# Altium integrated library TI Power Management Battery Management.IntLib: 950 symbols (part 10 of 48) (continued)
## BQ2016DBQG4 (continued)

## BQ2018SN-E1
designator U?
Multi-Chemistry Charge / Discharge Counter with High-Speed 1-Wire I / F (HDQ), -20 to 70 degC, 8-pin SOIC (D), Green (RoHS & no Sb/Br); PartNumber: BQ2018SN-E1; Manufacturer: Texas Instruments; Lead Acid: Y; Over Voltage Protection: N; SubFamily: Battery Fuel Gauge; DatasheetVersion: SLUS003; PackageVersion: revM, Jun-2011; PackageReference: D8; PackageDescription: 8-Pin Plastic Small Outline Integrated Circuit, 4.9 x 3.9 mm, Pitch 1.27 mm Pitch; Supplier 1: Digi-Key; Supplier Part Number 1: 296-2221-5-ND; Supplier Part Number 3: 595-BQ2018SN-E1; Eco-Plan: Green (RoHS & no Sb/Br); Li-Ion: Y; Li-Polymer: Y; NiCd: Y; NiMH: Y; Mounting Technology: Surface Mount; Code_JEDEC: MS-012AA; ComponentLink1Description: Datasheet; ComponentLink1URL: http://www.ti.com/general/docs/lit/getliterature.tsp?genericPartNumber=BQ2018&fileType=pdf
footprint D8_N (SOIC, 8-Leads, Body 4.9x3.9mm, Pitch 1.27mm, IPC Medium Density)
footprint D8_L (SOIC, 8-Leads, Body 4.9x3.9mm, Pitch 1.27mm, IPC High Density)
footprint D8_M (SOIC, 8-Leads, Body 4.9x3.9mm, Pitch 1.27mm, IPC Low Density)
pins: 1 REG (power) "Regulator output.REG is the output of the operational transconductance amplifier (OTA) that drives an external pass n-channel JFET to provide an optional regulated supply. The supply is regulated at 3.7V nominal.", 2 VCC (power) "Supply voltage input.When regulated by the REG output, VCC is 3.7V +/-200mV. When the REG output is not used, the valid operating range is 2.8V to 5.5V.", 3 VSS (power) "Ground", 4 HDQ (io) "Data input/output.This bi-directional input/output communicates the register information to the host system. HDQ is open drain and requires a pullup/down resistor in the battery pack to disable/enable sleep mode if the pack (See Datasheet)", 5 RBI (power) "Register backup input.This input maintains the internal register states during periods when VCC is below the minimum operating voltage.", 6 SR2 (in) "Current sense input 2.The bq2018 interprets charge and discharge activity by monitoring and integrating the voltage drop (VSR) across pins SR1 and SR2.The SR1 input connects to the sense resistor and the negative terminal of (See Datasheet)", 7 SR1 (in) "Current sense input 1.The bq2018 interprets charge and discharge activity by monitoring and integrating the voltage drop (VSR) across pins SR1 and SR2.The SR1 input connects to the sense resistor and the negative terminal of (See Datasheet)", 8 ~{WAKE} (hiz) "Wake-up output.When asserted, this output is used to indicate that the charge or discharge activity is above a programmed minimal level."

## BQ2018SN-E1TR
designator U?
Multi-Chemistry Charge / Discharge Counter with High-Speed 1-Wire I / F (HDQ), -20 to 70 degC, 8-pin SOIC (D), Green (RoHS & no Sb/Br); PartNumber: BQ2018SN-E1TR; Manufacturer: Texas Instruments; Lead Acid: Y; Over Voltage Protection: N; SubFamily: Battery Fuel Gauge; DatasheetVersion: SLUS003; PackageVersion: revM, Jun-2011; PackageReference: D8; PackageDescription: 8-Pin Plastic Small Outline Integrated Circuit, 4.9 x 3.9 mm, Pitch 1.27 mm Pitch; Supplier 1: Digi-Key; Supplier Part Number 1: BQ2018SN-E1TR-ND; Supplier Part Number 3: 595-BQ2018SN-E1TR; Eco-Plan: Green (RoHS & no Sb/Br); Li-Ion: Y; Li-Polymer: Y; NiCd: Y; NiMH: Y; Mounting Technology: Surface Mount; Code_JEDEC: MS-012AA; ComponentLink1Description: Datasheet; ComponentLink1URL: http://www.ti.com/general/docs/lit/getliterature.tsp?genericPartNumber=BQ2018&fileType=pdf
footprint D8_N (SOIC, 8-Leads, Body 4.9x3.9mm, Pitch 1.27mm, IPC Medium Density)
footprint D8_L (SOIC, 8-Leads, Body 4.9x3.9mm, Pitch 1.27mm, IPC High Density)
footprint D8_M (SOIC, 8-Leads, Body 4.9x3.9mm, Pitch 1.27mm, IPC Low Density)
pins: 1 REG (power) "Regulator output.REG is the output of the operational transconductance amplifier (OTA) that drives an external pass n-channel JFET to provide an optional regulated supply. The supply is regulated at 3.7V nominal.", 2 VCC (power) "Supply voltage input.When regulated by the REG output, VCC is 3.7V +/-200mV. When the REG output is not used, the valid operating range is 2.8V to 5.5V.", 3 VSS (power) "Ground", 4 HDQ (io) "Data input/output.This bi-directional input/output communicates the register information to the host system. HDQ is open drain and requires a pullup/down resistor in the battery pack to disable/enable sleep mode if the pack (See Datasheet)", 5 RBI (power) "Register backup input.This input maintains the internal register states during periods when VCC is below the minimum operating voltage.", 6 SR2 (in) "Current sense input 2.The bq2018 interprets charge and discharge activity by monitoring and integrating the voltage drop (VSR) across pins SR1 and SR2.The SR1 input connects to the sense resistor and the negative terminal of (See Datasheet)", 7 SR1 (in) "Current sense input 1.The bq2018 interprets charge and discharge activity by monitoring and integrating the voltage drop (VSR) across pins SR1 and SR2.The SR1 input connects to the sense resistor and the negative terminal of (See Datasheet)", 8 ~{WAKE} (hiz) "Wake-up output.When asserted, this output is used to indicate that the charge or discharge activity is above a programmed minimal level."

## BQ2018SN-E1TRG4
designator U?
Multi-Chemistry Charge / Discharge Counter with High-Speed 1-Wire I / F (HDQ), -20 to 70 degC, 8-pin SOIC (D), Green (RoHS & no Sb/Br); PartNumber: BQ2018SN-E1TRG4; Manufacturer: Texas Instruments; Lead Acid: Y; Over Voltage Protection: N; SubFamily: Battery Fuel Gauge; DatasheetVersion: SLUS003; PackageVersion: revM, Jun-2011; PackageReference: D8; PackageDescription: 8-Pin Plastic Small Outline Integrated Circuit, 4.9 x 3.9 mm, Pitch 1.27 mm Pitch; Supplier 1: Digi-Key; Supplier Part Number 1: BQ2018SN-E1TRG4-ND; Supplier Part Number 3: 595-BQ2018SN-E1TRG4; Eco-Plan: Green (RoHS & no Sb/Br); Li-Ion: Y; Li-Polymer: Y; NiCd: Y; NiMH: Y; Mounting Technology: Surface Mount; Code_JEDEC: MS-012AA; ComponentLink1Description: Datasheet; ComponentLink1URL: http://www.ti.com/general/docs/lit/getliterature.tsp?genericPartNumber=BQ2018&fileType=pdf
footprint D8_N (SOIC, 8-Leads, Body 4.9x3.9mm, Pitch 1.27mm, IPC Medium Density)
footprint D8_L (SOIC, 8-Leads, Body 4.9x3.9mm, Pitch 1.27mm, IPC High Density)
footprint D8_M (SOIC, 8-Leads, Body 4.9x3.9mm, Pitch 1.27mm, IPC Low Density)
pins: 1 REG (power) "Regulator output.REG is the output of the operational transconductance amplifier (OTA) that drives an external pass n-channel JFET to provide an optional regulated supply. The supply is regulated at 3.7V nominal.", 2 VCC (power) "Supply voltage input.When regulated by the REG output, VCC is 3.7V +/-200mV. When the REG output is not used, the valid operating range is 2.8V to 5.5V.", 3 VSS (power) "Ground", 4 HDQ (io) "Data input/output.This bi-directional input/output communicates the register information to the host system. HDQ is open drain and requires a pullup/down resistor in the battery pack to disable/enable sleep mode if the pack (See Datasheet)", 5 RBI (power) "Register backup input.This input maintains the internal register states during periods when VCC is below the minimum operating voltage.", 6 SR2 (in) "Current sense input 2.The bq2018 interprets charge and discharge activity by monitoring and integrating the voltage drop (VSR) across pins SR1 and SR2.The SR1 input connects to the sense resistor and the negative terminal of (See Datasheet)", 7 SR1 (in) "Current sense input 1.The bq2018 interprets charge and discharge activity by monitoring and integrating the voltage drop (VSR) across pins SR1 and SR2.The SR1 input connects to the sense resistor and the negative terminal of (See Datasheet)", 8 ~{WAKE} (hiz) "Wake-up output.When asserted, this output is used to indicate that the charge or discharge activity is above a programmed minimal level."

## BQ2018TS-E1
designator U?
Multi-Chemistry Charge / Discharge Counter with High-Speed 1-Wire I / F (HDQ), -20 to 70 degC, 8-pin TSSOP (PW), Green (RoHS & no Sb/Br); PartNumber: BQ2018TS-E1; Manufacturer: Texas Instruments; Lead Acid: Y; Over Voltage Protection: N; SubFamily: Battery Fuel Gauge; DatasheetVersion: SLUS003; PackageVersion: revG, Feb-2011; PackageReference: PW8; PackageDescription: 8-Pin Plastic Thin Small Outline Package 3 x 4.4 mm Body ,0.65 mm Pitch; Supplier 1: Digi-Key; Supplier Part Number 1: 296-2222-5-ND; Supplier Part Number 3: 595-BQ2018TS-E1; Eco-Plan: Green (RoHS & no Sb/Br); Li-Ion: Y; Li-Polymer: Y; NiCd: Y; NiMH: Y; Mounting Technology: Surface Mount; Code_JEDEC: MO-153; ComponentLink1Description: Datasheet; ComponentLink1URL: http://www.ti.com/general/docs/lit/getliterature.tsp?genericPartNumber=BQ2018&fileType=pdf
footprint PW8_N (TSOP, 8-Leads, Body 3x4.4mm, Pitch 0.65mm, IPC Medium Density)
footprint PW8_L (TSOP, 8-Leads, Body 3x4.4mm, Pitch 0.65mm, IPC High Density)
footprint PW8_M (TSOP, 8-Leads, Body 3x4.4mm, Pitch 0.65mm, IPC Low Density)
pins: 1 REG (power) "Regulator output.REG is the output of the operational transconductance amplifier (OTA) that drives an external pass n-channel JFET to provide an opt ional  regulated  supply. The  supply  is regulated at 3.7V nominal.", 2 VCC (power) "Supply voltage input.When regulated by the REG output, VCC is 3.7V +/-200mV. When the REG output is not used, the valid operating range is 2.8V to 5.5V.", 3 VSS (power) "Ground", 4 HDQ (io) "Data input/output.This bi-directional input/output communicates the register information to the host system. HDQ is open drain and requires a pullup/down resistor in the battery pack to disable/enable sleep mode if the pack (See Datasheet)", 5 RBI (power) "Register backup input.This input maintains the internal register states during periods when VCC is below the minimum operating voltage.", 6 SR2 (in) "Current sense inputs.The bq2018 interprets charge and discharge activity by monitoring and integrating the voltage drop (VSR) across pins SR1 and SR2.The SR1 input connects to the sense resistor and the negative terminal of (See Datasheet)", 7 SR1 (in) "Current sense inputs.The bq2018 interprets charge and discharge activity by monitoring and integrating the voltage drop (VSR) across pins SR1 and SR2.The SR1 input connects to the sense resistor and the negative terminal of (See Datasheet)", 8 ~{WAKE} (hiz) "Wake-up output.When asserted, this output is used to indicate that the charge or discharge activity is above a programmed minimal level."

## BQ2018TS-E1TR
designator U?
Multi-Chemistry Charge / Discharge Counter with High-Speed 1-Wire I / F (HDQ), -20 to 70 degC, 8-pin TSSOP (PW), Green (RoHS & no Sb/Br); PartNumber: BQ2018TS-E1TR; Manufacturer: Texas Instruments; Lead Acid: Y; Over Voltage Protection: N; SubFamily: Battery Fuel Gauge; DatasheetVersion: SLUS003; PackageVersion: revG, Feb-2011; PackageReference: PW8; PackageDescription: 8-Pin Plastic Thin Small Outline Package 3 x 4.4 mm Body ,0.65 mm Pitch; Supplier 1: Digi-Key; Supplier Part Number 1: BQ2018TS-E1TR-ND; Supplier Part Number 3: 595-BQ2018TS-E1TR; Eco-Plan: Green (RoHS & no Sb/Br); Li-Ion: Y; Li-Polymer: Y; NiCd: Y; NiMH: Y; Mounting Technology: Surface Mount; Code_JEDEC: MO-153; ComponentLink1Description: Datasheet; ComponentLink1URL: http://www.ti.com/general/docs/lit/getliterature.tsp?genericPartNumber=BQ2018&fileType=pdf
footprint PW8_N (TSOP, 8-Leads, Body 3x4.4mm, Pitch 0.65mm, IPC Medium Density)
footprint PW8_L (TSOP, 8-Leads, Body 3x4.4mm, Pitch 0.65mm, IPC High Density)
footprint PW8_M (TSOP, 8-Leads, Body 3x4.4mm, Pitch 0.65mm, IPC Low Density)
pins: 1 REG (power) "Regulator output.REG is the output of the operational transconductance amplifier (OTA) that drives an external pass n-channel JFET to provide an opt ional  regulated  supply. The  supply  is regulated at 3.7V nominal.", 2 VCC (power) "Supply voltage input.When regulated by the REG output, VCC is 3.7V +/-200mV. When the REG output is not used, the valid operating range is 2.8V to 5.5V.", 3 VSS (power) "Ground", 4 HDQ (io) "Data input/output.This bi-directional input/output communicates the register information to the host system. HDQ is open drain and requires a pullup/down resistor in the battery pack to disable/enable sleep mode if the pack (See Datasheet)", 5 RBI (power) "Register backup input.This input maintains the internal register states during periods when VCC is below the minimum operating voltage.", 6 SR2 (in) "Current sense inputs.The bq2018 interprets charge and discharge activity by monitoring and integrating the voltage drop (VSR) across pins SR1 and SR2.The SR1 input connects to the sense resistor and the negative terminal of (See Datasheet)", 7 SR1 (in) "Current sense inputs.The bq2018 interprets charge and discharge activity by monitoring and integrating the voltage drop (VSR) across pins SR1 and SR2.The SR1 input connects to the sense resistor and the negative terminal of (See Datasheet)", 8 ~{WAKE} (hiz) "Wake-up output.When asserted, this output is used to indicate that the charge or discharge activity is above a programmed minimal level."

## BQ2018TS-E1TRG4
designator U?
Multi-Chemistry Charge / Discharge Counter with High-Speed 1-Wire I / F (HDQ), -20 to 70 degC, 8-pin TSSOP (PW), Green (RoHS & no Sb/Br); PartNumber: BQ2018TS-E1TRG4; Manufacturer: Texas Instruments; Lead Acid: Y; Over Voltage Protection: N; SubFamily: Battery Fuel Gauge; DatasheetVersion: SLUS003; PackageVersion: revG, Feb-2011; PackageReference: PW8; PackageDescription: 8-Pin Plastic Thin Small Outline Package 3 x 4.4 mm Body ,0.65 mm Pitch; Supplier 1: Digi-Key; Supplier Part Number 1: BQ2018TS-E1TRG4-ND; Supplier Part Number 3: 595-BQ2018TS-E1TRG4; Eco-Plan: Green (RoHS & no Sb/Br); Li-Ion: Y; Li-Polymer: Y; NiCd: Y; NiMH: Y; Mounting Technology: Surface Mount; Code_JEDEC: MO-153; ComponentLink1Description: Datasheet; ComponentLink1URL: http://www.ti.com/general/docs/lit/getliterature.tsp?genericPartNumber=BQ2018&fileType=pdf
footprint PW8_N (TSOP, 8-Leads, Body 3x4.4mm, Pitch 0.65mm, IPC Medium Density)
footprint PW8_L (TSOP, 8-Leads, Body 3x4.4mm, Pitch 0.65mm, IPC High Density)
footprint PW8_M (TSOP, 8-Leads, Body 3x4.4mm, Pitch 0.65mm, IPC Low Density)
pins: 1 REG (power) "Regulator output.REG is the output of the operational transconductance amplifier (OTA) that drives an external pass n-channel JFET to provide an opt ional  regulated  supply. The  supply  is regulated at 3.7V nominal.", 2 VCC (power) "Supply voltage input.When regulated by the REG output, VCC is 3.7V +/-200mV. When the REG output is not used, the valid operating range is 2.8V to 5.5V.", 3 VSS (power) "Ground", 4 HDQ (io) "Data input/output.This bi-directional input/output communicates the register information to the host system. HDQ is open drain and requires a pullup/down resistor in the battery pack to disable/enable sleep mode if the pack (See Datasheet)", 5 RBI (power) "Register backup input.This input maintains the internal register states during periods when VCC is below the minimum operating voltage.", 6 SR2 (in) "Current sense inputs.The bq2018 interprets charge and discharge activity by monitoring and integrating the voltage drop (VSR) across pins SR1 and SR2.The SR1 input connects to the sense resistor and the negative terminal of (See Datasheet)", 7 SR1 (in) "Current sense inputs.The bq2018 interprets charge and discharge activity by monitoring and integrating the voltage drop (VSR) across pins SR1 and SR2.The SR1 input connects to the sense resistor and the negative terminal of (See Datasheet)", 8 ~{WAKE} (hiz) "Wake-up output.When asserted, this output is used to indicate that the charge or discharge activity is above a programmed minimal level."

## BQ2019PW
designator U?
FLASH-Based Precision Multi-Chemistry Charge / Discharge Counter with High-Speed 1-Wire I / F (HDQ) , -20 to 70 degC, 8-pin TSSOP (PW), Green (RoHS & no Sb/Br); PartNumber: BQ2019PW; Manufacturer: Texas Instruments; Lead Acid: Y; Over Voltage Protection: N; SubFamily: Battery Fuel Gauge; DatasheetVersion: SLUS465E; PackageVersion: revG, Feb-2011; PackageReference: PW8; PackageDescription: 8-Pin Plastic Thin Small Outline Package 3 x 4.4 mm Body ,0.65 mm Pitch; Supplier 1: Digi-Key; Supplier Part Number 1: 296-9348-5-ND; Supplier Part Number 3: 595-BQ2019PW; Eco-Plan: Green (RoHS & no Sb/Br); Li-Ion: Y; Li-Polymer: Y; NiCd: Y; NiMH: Y; Mounting Technology: Surface Mount; Code_JEDEC: MO-153; ComponentLink1Description: Datasheet; ComponentLink1URL: http://www.ti.com/general/docs/lit/getliterature.tsp?genericPartNumber=BQ2019&fileType=pdf
footprint PW8_N (TSOP, 8-Leads, Body 3x4.4mm, Pitch 0.65mm, IPC Medium Density)
footprint PW8_L (TSOP, 8-Leads, Body 3x4.4mm, Pitch 0.65mm, IPC High Density)
footprint PW8_M (TSOP, 8-Leads, Body 3x4.4mm, Pitch 0.65mm, IPC Low Density)
pins: 1 REG (power) "Regulator output", 2 VCC (power) "Supply voltage", 3 VSS (power) "Ground", 4 HDQ (io) "Single-wire HDQ interface", 5 OSC (in) "Time-base adjust for the oscillator", 6 DC "Internal connection only. Do not connect", 7 SR (in) "Current-sense input", 8 STAT (oc) "Open-drain status output"

## BQ2019PWG4
designator U?
FLASH-Based Precision Multi-Chemistry Charge / Discharge Counter with High-Speed 1-Wire I / F (HDQ) , -20 to 70 degC, 8-pin TSSOP (PW), Green (RoHS & no Sb/Br); PartNumber: BQ2019PWG4; Manufacturer: Texas Instruments; Lead Acid: Y; Over Voltage Protection: N; SubFamily: Battery Fuel Gauge; DatasheetVersion: SLUS465E; PackageVersion: revG, Feb-2011; PackageReference: PW8; PackageDescription: 8-Pin Plastic Thin Small Outline Package 3 x 4.4 mm Body ,0.65 mm Pitch; Supplier 1: Digi-Key; Supplier Part Number 1: BQ2019PWG4-ND; Supplier Part Number 3: 53K9216; Eco-Plan: Green (RoHS & no Sb/Br); Li-Ion: Y; Li-Polymer: Y; NiCd: Y; NiMH: Y; Mounting Technology: Surface Mount; Code_JEDEC: MO-153; ComponentLink1Description: Datasheet; ComponentLink1URL: http://www.ti.com/general/docs/lit/getliterature.tsp?genericPartNumber=BQ2019&fileType=pdf
footprint PW8_N (TSOP, 8-Leads, Body 3x4.4mm, Pitch 0.65mm, IPC Medium Density)
footprint PW8_L (TSOP, 8-Leads, Body 3x4.4mm, Pitch 0.65mm, IPC High Density)
footprint PW8_M (TSOP, 8-Leads, Body 3x4.4mm, Pitch 0.65mm, IPC Low Density)
pins: 1 REG (power) "Regulator output", 2 VCC (power) "Supply voltage", 3 VSS (power) "Ground", 4 HDQ (io) "Single-wire HDQ interface", 5 OSC (in) "Time-base adjust for the oscillator", 6 DC "Internal connection only. Do not connect", 7 SR (in) "Current-sense input", 8 STAT (oc) "Open-drain status output"

## BQ2019PWR
designator U?
FLASH-Based Precision Multi-Chemistry Charge / Discharge Counter with High-Speed 1-Wire I / F (HDQ) , -20 to 70 degC, 8-pin TSSOP (PW), Green (RoHS & no Sb/Br); PartNumber: BQ2019PWR; Manufacturer: Texas Instruments; Lead Acid: Y; Over Voltage Protection: N; SubFamily: Battery Fuel Gauge; DatasheetVersion: SLUS465E; PackageVersion: revG, Feb-2011; PackageReference: PW8; PackageDescription: 8-Pin Plastic Thin Small Outline Package 3 x 4.4 mm Body ,0.65 mm Pitch; Supplier 1: Digi-Key; Supplier Part Number 1: BQ2019PWR-ND; Supplier Part Number 3: 595-BQ2019PWR; Eco-Plan: Green (RoHS & no Sb/Br); Li-Ion: Y; Li-Polymer: Y; NiCd: Y; NiMH: Y; Mounting Technology: Surface Mount; Code_JEDEC: MO-153; ComponentLink1Description: Datasheet; ComponentLink1URL: http://www.ti.com/general/docs/lit/getliterature.tsp?genericPartNumber=BQ2019&fileType=pdf
footprint PW8_N (TSOP, 8-Leads, Body 3x4.4mm, Pitch 0.65mm, IPC Medium Density)
footprint PW8_L (TSOP, 8-Leads, Body 3x4.4mm, Pitch 0.65mm, IPC High Density)
footprint PW8_M (TSOP, 8-Leads, Body 3x4.4mm, Pitch 0.65mm, IPC Low Density)
pins: 1 REG (power) "Regulator output", 2 VCC (power) "Supply voltage", 3 VSS (power) "Ground", 4 HDQ (io) "Single-wire HDQ interface", 5 OSC (in) "Time-base adjust for the oscillator", 6 DC "Internal connection only. Do not connect", 7 SR (in) "Current-sense input", 8 STAT (oc) "Open-drain status output"

## BQ2019PWRG4
designator U?
FLASH-Based Precision Multi-Chemistry Charge / Discharge Counter with High-Speed 1-Wire I / F (HDQ) , -20 to 70 degC, 8-pin TSSOP (PW), Green (RoHS & no Sb/Br); PartNumber: BQ2019PWRG4; Manufacturer: Texas Instruments; Lead Acid: Y; Over Voltage Protection: N; SubFamily: Battery Fuel Gauge; DatasheetVersion: SLUS465E; PackageVersion: revG, Feb-2011; PackageReference: PW8; PackageDescription: 8-Pin Plastic Thin Small Outline Package 3 x 4.4 mm Body ,0.65 mm Pitch; Supplier 1: Digi-Key; Supplier Part Number 1: BQ2019PWRG4-ND; Supplier Part Number 3: 595-BQ2019PWRG4; Eco-Plan: Green (RoHS & no Sb/Br); Li-Ion: Y; Li-Polymer: Y; NiCd: Y; NiMH: Y; Mounting Technology: Surface Mount; Code_JEDEC: MO-153; ComponentLink1Description: Datasheet; ComponentLink1URL: http://www.ti.com/general/docs/lit/getliterature.tsp?genericPartNumber=BQ2019&fileType=pdf
footprint PW8_N (TSOP, 8-Leads, Body 3x4.4mm, Pitch 0.65mm, IPC Medium Density)
footprint PW8_L (TSOP, 8-Leads, Body 3x4.4mm, Pitch 0.65mm, IPC High Density)
footprint PW8_M (TSOP, 8-Leads, Body 3x4.4mm, Pitch 0.65mm, IPC Low Density)
pins: 1 REG (power) "Regulator output", 2 VCC (power) "Supply voltage", 3 VSS (power) "Ground", 4 HDQ (io) "Single-wire HDQ interface", 5 OSC (in) "Time-base adjust for the oscillator", 6 DC "Internal connection only. Do not connect", 7 SR (in) "Current-sense input", 8 STAT (oc) "Open-drain status output"

## BQ2022ADBZR
designator U?
1K Bit Serial EPROM with SDQ Interface, -20 to 70 degC, 3-pin SOT-23 (DBZ), Green (RoHS & no Sb/Br); PartNumber: BQ2022ADBZR; Manufacturer: Texas Instruments; Lead Acid: N; SubFamily: Battery Fuel Gauge,Battery Authentication; DatasheetVersion: SLUS724C; PackageVersion: revB, Apr-2005; PackageReference: DBZ3; PackageDescription: 3-Pin Plastic Small-Outline Package, 0.95 mm Pitch, 2.4 mm Lead Span; Supplier 1: Digi-Key; Supplier Part Number 1: 296-20742-2-ND; Supplier Part Number 3: 296-20742-6-ND; Eco-Plan: Green (RoHS & no Sb/Br); Li-Ion: N; Li-Polymer: N; NiCd: N; NiMH: N; Over Voltage Protection: N; Mounting Technology: Surface Mount; Code_JEDEC: TO-236-AB; ComponentLink1Description: Datasheet; ComponentLink1URL: http://www.ti.com/general/docs/lit/getliterature.tsp?genericPartNumber=BQ2022A&fileType=pdf
footprint DBZ3_N (SOT23, 3-Leads, Body 2.9x1.3mm, Pitch 0.95mm, Lead Span 2.4mm, IPC Medium Density)
footprint DBZ3_L (SOT23, 3-Leads, Body 2.9x1.3mm, Pitch 0.95mm, Lead Span 2.4mm, IPC High Density)
footprint DBZ3_M (SOT23, 3-Leads, Body 2.9x1.3mm, Pitch 0.95mm, Lead Span 2.4mm, IPC Low Density)
pins: 1 SDQ (io) "Data", 2 VSS (power) "Ground. Both pins should be connected to system ground.", 3 VSS (power) "Ground. Both pins should be connected to system ground."

## BQ2022ADBZRG4
designator U?
1K Bit Serial EPROM with SDQ Interface, -20 to 70 degC, 3-pin SOT-23 (DBZ), Green (RoHS & no Sb/Br); PartNumber: BQ2022ADBZRG4; Manufacturer: Texas Instruments; Lead Acid: N; SubFamily: Battery Fuel Gauge,Battery Authentication; DatasheetVersion: SLUS724C; PackageVersion: revB, Apr-2005; PackageReference: DBZ3; PackageDescription: 3-Pin Plastic Small-Outline Package, 0.95 mm Pitch, 2.4 mm Lead Span; Supplier 1: Digi-Key; Supplier Part Number 1: BQ2022ADBZRG4-ND; Supplier Part Number 3: 595-BQ2022ADBZRG4; Eco-Plan: Green (RoHS & no Sb/Br); Li-Ion: N; Li-Polymer: N; NiCd: N; NiMH: N; Over Voltage Protection: N; Mounting Technology: Surface Mount; Code_JEDEC: TO-236-AB; ComponentLink1Description: Datasheet; ComponentLink1URL: http://www.ti.com/general/docs/lit/getliterature.tsp?genericPartNumber=BQ2022A&fileType=pdf
footprint DBZ3_N (SOT23, 3-Leads, Body 2.9x1.3mm, Pitch 0.95mm, Lead Span 2.4mm, IPC Medium Density)
footprint DBZ3_L (SOT23, 3-Leads, Body 2.9x1.3mm, Pitch 0.95mm, Lead Span 2.4mm, IPC High Density)
footprint DBZ3_M (SOT23, 3-Leads, Body 2.9x1.3mm, Pitch 0.95mm, Lead Span 2.4mm, IPC Low Density)
pins: 1 SDQ (io) "Data", 2 VSS (power) "Ground. Both pins should be connected to system ground.", 3 VSS (power) "Ground. Both pins should be connected to system ground."

## BQ2022ALPR
designator U?
1K Bit Serial EPROM with SDQ Interface, 0 to 70 degC, 3-pin TO-92 (LP), Green (RoHS & no Sb/Br); PartNumber: BQ2022ALPR; Manufacturer: Texas Instruments; Lead Acid: N; SubFamily: Battery Fuel Gauge,Battery Authentication; DatasheetVersion: SLUS724C; PackageVersion: revC, Oct-2001; PackageReference: LP3; PackageDescription: Plastic Cylindrical Package, Formed Lead Option (TO-92); Supplier 1: Digi-Key; Supplier Part Number 1: 296-21327-3-ND; Supplier Part Number 3: 1647890; Eco-Plan: Green (RoHS & no Sb/Br); Li-Ion: N; Li-Polymer: N; NiCd: N; NiMH: N; Over Voltage Protection: N; Mounting Technology: Through Hole; Code_JEDEC: TO-226-AA; ComponentLink1Description: Datasheet; ComponentLink1URL: http://www.ti.com/general/docs/lit/getliterature.tsp?genericPartNumber=BQ2022A&fileType=pdf
footprint LP3 (TO, Flat Index; 3 In-Line, Formed Axial Leads; Body Dia. 4.8mm; Leads 0.56 x 0.41 mm (max))
pins: 1 VSS (power) "GND", 2 SDQ (io) "Data", 3 NC "No connection. This pin should be connected to system ground or left floating."

## BQ2022ALPRE3
designator U?
1K Bit Serial EPROM with SDQ Interface, 0 to 70 degC, 3-pin TO-92 (LP), Green (RoHS & no Sb/Br); PartNumber: BQ2022ALPRE3; Manufacturer: Texas Instruments; Lead Acid: N; SubFamily: Battery Fuel Gauge,Battery Authentication; DatasheetVersion: SLUS724C; PackageVersion: revC, Oct-2001; PackageReference: LP3; PackageDescription: Plastic Cylindrical Package, Formed Lead Option (TO-92); Supplier 1: Digi-Key; Supplier Part Number 1: BQ2022ALPRE3-ND; Supplier Part Number 3: 595-BQ2022ALPRE3; Eco-Plan: Green (RoHS & no Sb/Br); Li-Ion: N; Li-Polymer: N; NiCd: N; NiMH: N; Over Voltage Protection: N; Mounting Technology: Through Hole; Code_JEDEC: TO-226-AA; ComponentLink1Description: Datasheet; ComponentLink1URL: http://www.ti.com/general/docs/lit/getliterature.tsp?genericPartNumber=BQ2022A&fileType=pdf
footprint LP3 (TO, Flat Index; 3 In-Line, Formed Axial Leads; Body Dia. 4.8mm; Leads 0.56 x 0.41 mm (max))
pins: 1 VSS (power) "GND", 2 SDQ (io) "Data", 3 NC "No connection. This pin should be connected to system ground or left floating."

## BQ2023PW
designator U?
Single-Wire Advanced Battery Monitor IC for Cellular and PDA Applications, -20 to 70 degC, 8-pin TSSOP (PW), Green (RoHS & no Sb/Br); PartNumber: BQ2023PW; Manufacturer: Texas Instruments; Lead Acid: Y; Over Voltage Protection: N; SubFamily: Battery Fuel Gauge; DatasheetVersion: SLUS480B; PackageVersion: revG, Feb-2011; PackageReference: PW8; PackageDescription: 8-Pin Plastic Thin Small Outline Package 3 x 4.4 mm Body ,0.65 mm Pitch; Supplier 1: Digi-Key; Supplier Part Number 1: 296-11861-5-ND; Supplier Part Number 3: 595-BQ2023PW; Eco-Plan: Green (RoHS & no Sb/Br); Li-Ion: Y; Li-Polymer: Y; NiCd: Y; NiMH: Y; Mounting Technology: Surface Mount; Code_JEDEC: MO-153; ComponentLink1Description: Datasheet; ComponentLink1URL: http://www.ti.com/general/docs/lit/getliterature.tsp?genericPartNumber=BQ2023&fileType=pdf
footprint PW8_N (TSOP, 8-Leads, Body 3x4.4mm, Pitch 0.65mm, IPC Medium Density)
footprint PW8_L (TSOP, 8-Leads, Body 3x4.4mm, Pitch 0.65mm, IPC High Density)
footprint PW8_M (TSOP, 8-Leads, Body 3x4.4mm, Pitch 0.65mm, IPC Low Density)
pins: 1 RBI (in) "Register backup input when VCC < V(POR), VCC output when VCC > V(POR)", 2 VCC (power) "Supply voltage", 3 VSS (power) "Ground", 4 SDQ (io) "Single-wire data input/output port", 5 PDET (in) "Pack removal detection input", 6 SRN (in) "Current sense input 2", 7 SRP (in) "Current sense input 1", 8 STAT (oc) "Open-drain status output"

## BQ2023PWG4
designator U?
Single-Wire Advanced Battery Monitor IC for Cellular and PDA Applications, -20 to 70 degC, 8-pin TSSOP (PW), Green (RoHS & no Sb/Br); PartNumber: BQ2023PWG4; Manufacturer: Texas Instruments; Lead Acid: Y; Over Voltage Protection: N; SubFamily: Battery Fuel Gauge; DatasheetVersion: SLUS480B; PackageVersion: revG, Feb-2011; PackageReference: PW8; PackageDescription: 8-Pin Plastic Thin Small Outline Package 3 x 4.4 mm Body ,0.65 mm Pitch; Supplier 1: Digi-Key; Supplier Part Number 1: BQ2023PWG4-ND; Supplier Part Number 3: 595-BQ2023PWG4; Eco-Plan: Green (RoHS & no Sb/Br); Li-Ion: Y; Li-Polymer: Y; NiCd: Y; NiMH: Y; Mounting Technology: Surface Mount; Code_JEDEC: MO-153; ComponentLink1Description: Datasheet; ComponentLink1URL: http://www.ti.com/general/docs/lit/getliterature.tsp?genericPartNumber=BQ2023&fileType=pdf
footprint PW8_N (TSOP, 8-Leads, Body 3x4.4mm, Pitch 0.65mm, IPC Medium Density)
footprint PW8_L (TSOP, 8-Leads, Body 3x4.4mm, Pitch 0.65mm, IPC High Density)
footprint PW8_M (TSOP, 8-Leads, Body 3x4.4mm, Pitch 0.65mm, IPC Low Density)
pins: 1 RBI (in) "Register backup input when VCC < V(POR), VCC output when VCC > V(POR)", 2 VCC (power) "Supply voltage", 3 VSS (power) "Ground", 4 SDQ (io) "Single-wire data input/output port", 5 PDET (in) "Pack removal detection input", 6 SRN (in) "Current sense input 2", 7 SRP (in) "Current sense input 1", 8 STAT (oc) "Open-drain status output"

## BQ2023PWR
designator U?
Single-Wire Advanced Battery Monitor IC for Cellular and PDA Applications, -20 to 70 degC, 8-pin TSSOP (PW), Green (RoHS & no Sb/Br); PartNumber: BQ2023PWR; Manufacturer: Texas Instruments; Lead Acid: Y; Over Voltage Protection: N; SubFamily: Battery Fuel Gauge; DatasheetVersion: SLUS480B; PackageVersion: revG, Feb-2011; PackageReference: PW8; PackageDescription: 8-Pin Plastic Thin Small Outline Package 3 x 4.4 mm Body ,0.65 mm Pitch; Supplier 1: Digi-Key; Supplier Part Number 1: BQ2023PWR-ND; Supplier Part Number 3: 595-BQ2023PWR; Eco-Plan: Green (RoHS & no Sb/Br); Li-Ion: Y; Li-Polymer: Y; NiCd: Y; NiMH: Y; Mounting Technology: Surface Mount; Code_JEDEC: MO-153; ComponentLink1Description: Datasheet; ComponentLink1URL: http://www.ti.com/general/docs/lit/getliterature.tsp?genericPartNumber=BQ2023&fileType=pdf
footprint PW8_N (TSOP, 8-Leads, Body 3x4.4mm, Pitch 0.65mm, IPC Medium Density)
footprint PW8_L (TSOP, 8-Leads, Body 3x4.4mm, Pitch 0.65mm, IPC High Density)
footprint PW8_M (TSOP, 8-Leads, Body 3x4.4mm, Pitch 0.65mm, IPC Low Density)
pins: 1 RBI (in) "Register backup input when VCC < V(POR), VCC output when VCC > V(POR)", 2 VCC (power) "Supply voltage", 3 VSS (power) "Ground", 4 SDQ (io) "Single-wire data input/output port", 5 PDET (in) "Pack removal detection input", 6 SRN (in) "Current sense input 2", 7 SRP (in) "Current sense input 1", 8 STAT (oc) "Open-drain status output"

## BQ2023PWRG4
designator U?
Single-Wire Advanced Battery Monitor IC for Cellular and PDA Applications, -20 to 70 degC, 8-pin TSSOP (PW), Green (RoHS & no Sb/Br); PartNumber: BQ2023PWRG4; Manufacturer: Texas Instruments; Lead Acid: Y; Over Voltage Protection: N; SubFamily: Battery Fuel Gauge; DatasheetVersion: SLUS480B; PackageVersion: revG, Feb-2011; PackageReference: PW8; PackageDescription: 8-Pin Plastic Thin Small Outline Package 3 x 4.4 mm Body ,0.65 mm Pitch; Supplier 1: Digi-Key; Supplier Part Number 1: BQ2023PWRG4-ND; Supplier Part Number 3: 595-BQ2023PWRG4; Eco-Plan: Green (RoHS & no Sb/Br); Li-Ion: Y; Li-Polymer: Y; NiCd: Y; NiMH: Y; Mounting Technology: Surface Mount; Code_JEDEC: MO-153; ComponentLink1Description: Datasheet; ComponentLink1URL: http://www.ti.com/general/docs/lit/getliterature.tsp?genericPartNumber=BQ2023&fileType=pdf
footprint PW8_N (TSOP, 8-Leads, Body 3x4.4mm, Pitch 0.65mm, IPC Medium Density)
footprint PW8_L (TSOP, 8-Leads, Body 3x4.4mm, Pitch 0.65mm, IPC High Density)
footprint PW8_M (TSOP, 8-Leads, Body 3x4.4mm, Pitch 0.65mm, IPC Low Density)
pins: 1 RBI (in) "Register backup input when VCC < V(POR), VCC output when VCC > V(POR)", 2 VCC (power) "Supply voltage", 3 VSS (power) "Ground", 4 SDQ (io) "Single-wire data input/output port", 5 PDET (in) "Pack removal detection input", 6 SRN (in) "Current sense input 2", 7 SRP (in) "Current sense input 1", 8 STAT (oc) "Open-drain status output"

## BQ2024DBZR
designator U?
1.5 K Bit Serial EPROM with SDQ Interface, -20 to 70 degC, 3-pin SOT-23 (DBZ), Green (RoHS & no Sb/Br); PartNumber: BQ2024DBZR; Manufacturer: Texas Instruments; Lead Acid: Y; Over Voltage Protection: N; SubFamily: Battery Fuel Gauge; DatasheetVersion: SLUS770; PackageVersion: revB, Apr-2005; PackageReference: DBZ3; PackageDescription: 3-Pin Plastic Small-Outline Package, 0.95 mm Pitch, 2.4 mm Lead Span; Supplier 1: Digi-Key; Supplier Part Number 1: 296-21948-2-ND; Supplier Part Number 3: 296-21948-6-ND; Eco-Plan: Green (RoHS & no Sb/Br); Li-Ion: Y; Li-Polymer: Y; NiCd: Y; NiMH: Y; Mounting Technology: Surface Mount; Code_JEDEC: TO-236-AB; ComponentLink1Description: Datasheet; ComponentLink1URL: http://www.ti.com/general/docs/lit/getliterature.tsp?genericPartNumber=BQ2024&fileType=pdf
footprint DBZ3_N (SOT23, 3-Leads, Body 2.9x1.3mm, Pitch 0.95mm, Lead Span 2.4mm, IPC Medium Density)
footprint DBZ3_L (SOT23, 3-Leads, Body 2.9x1.3mm, Pitch 0.95mm, Lead Span 2.4mm, IPC High Density)
footprint DBZ3_M (SOT23, 3-Leads, Body 2.9x1.3mm, Pitch 0.95mm, Lead Span 2.4mm, IPC Low Density)
pins: 1 SDQ (in) "Data", 2 VSS (power) "Ground", 3 VSS (power) "Ground"

## BQ2024DBZRG4
designator U?
1.5 K Bit Serial EPROM with SDQ Interface, -20 to 70 degC, 3-pin SOT-23 (DBZ), Green (RoHS & no Sb/Br); PartNumber: BQ2024DBZRG4; Manufacturer: Texas Instruments; Lead Acid: Y; Over Voltage Protection: N; SubFamily: Battery Fuel Gauge; DatasheetVersion: SLUS770; PackageVersion: revB, Apr-2005; PackageReference: DBZ3; PackageDescription: 3-Pin Plastic Small-Outline Package, 0.95 mm Pitch, 2.4 mm Lead Span; Supplier 1: Digi-Key; Supplier Part Number 1: BQ2024DBZRG4-ND; Eco-Plan: Green (RoHS & no Sb/Br); Li-Ion: Y; Li-Polymer: Y; NiCd: Y; NiMH: Y; Mounting Technology: Surface Mount; Code_JEDEC: TO-236-AB; ComponentLink1Description: Datasheet; ComponentLink1URL: http://www.ti.com/general/docs/lit/getliterature.tsp?genericPartNumber=BQ2024&fileType=pdf
footprint DBZ3_N (SOT23, 3-Leads, Body 2.9x1.3mm, Pitch 0.95mm, Lead Span 2.4mm, IPC Medium Density)
footprint DBZ3_L (SOT23, 3-Leads, Body 2.9x1.3mm, Pitch 0.95mm, Lead Span 2.4mm, IPC High Density)
footprint DBZ3_M (SOT23, 3-Leads, Body 2.9x1.3mm, Pitch 0.95mm, Lead Span 2.4mm, IPC Low Density)
pins: 1 SDQ (in) "Data", 2 VSS (power) "Ground", 3 VSS (power) "Ground"

## BQ2026DBZR
designator U?
1.5 K Bit Serial EPROM with SDQ Interface, -20 to 70 degC, 3-pin SOT-23 (DBZ), Green (RoHS & no Sb/Br); PartNumber: BQ2026DBZR; Manufacturer: Texas Instruments; Lead Acid: N; SubFamily: Battery Fuel Gauge; DatasheetVersion: SLUS938; PackageVersion: revB, Apr-2005; PackageReference: DBZ3; PackageDescription: 3-Pin Plastic Small-Outline Package, 0.95 mm Pitch, 2.4 mm Lead Span; Supplier 1: Digi-Key; Supplier Part Number 1: 296-30068-2-ND; Supplier Part Number 3: 296-30068-6-ND; Eco-Plan: Green (RoHS & no Sb/Br); Li-Ion: N; Li-Polymer: N; NiCd: N; NiMH: N; Over Voltage Protection: N; Mounting Technology: Surface Mount; Code_JEDEC: TO-236-AB; ComponentLink1Description: Datasheet; ComponentLink1URL: http://www.ti.com/general/docs/lit/getliterature.tsp?genericPartNumber=BQ2026&fileType=pdf
footprint DBZ3_N (SOT23, 3-Leads, Body 2.9x1.3mm, Pitch 0.95mm, Lead Span 2.4mm, IPC Medium Density)
footprint DBZ3_L (SOT23, 3-Leads, Body 2.9x1.3mm, Pitch 0.95mm, Lead Span 2.4mm, IPC High Density)
footprint DBZ3_M (SOT23, 3-Leads, Body 2.9x1.3mm, Pitch 0.95mm, Lead Span 2.4mm, IPC Low Density)
pins: 1 SDQ (io) "Data", 2 VSS (power) "Ground", 3 VSS (power) "Ground"

## BQ2026LPR
designator U?
1.5 K Bit Serial EPROM with SDQ Interface, -20 to 70 degC, 3-pin TO-92 (LP), Pb-Free (RoHS); PartNumber: BQ2026LPR; Manufacturer: Texas Instruments; Lead Acid: N; SubFamily: Battery Fuel Gauge; DatasheetVersion: SLUS938; PackageVersion: revC, Oct-2001; PackageReference: LP3; PackageDescription: Plastic Cylindrical Package, Formed Lead Option (TO-92); Supplier 1: Digi-Key; Supplier Part Number 1: 296-30069-2-ND; Supplier Part Number 3: 296-30069-6-ND; Eco-Plan: Pb-Free (RoHS); Li-Ion: N; Li-Polymer: N; NiCd: N; NiMH: N; Over Voltage Protection: N; Mounting Technology: Through Hole; Code_JEDEC: TO-226-AA; ComponentLink1Description: Datasheet; ComponentLink1URL: http://www.ti.com/general/docs/lit/getliterature.tsp?genericPartNumber=BQ2026&fileType=pdf
footprint LP3 (TO, Flat Index; 3 In-Line, Formed Axial Leads; Body Dia. 4.8mm; Leads 0.56 x 0.41 mm (max))
pins: 1 VSS (power) "Ground", 2 SDQ (io) "Data", 3 VSS (power) "Ground"